# Altium footprint library Cty1.PcbLib: 869 footprints (part 53 of 55)
Each footprint in its own frame and in the unit in brackets; x right, y up, seen from the top. Pads: shape width x height; smd on the part's side, far side on the other; paste and mask are expansions set on the pad; w line width, h text height; cw(c..) or ccw(c..) is an arc to the next point about the centre after c.
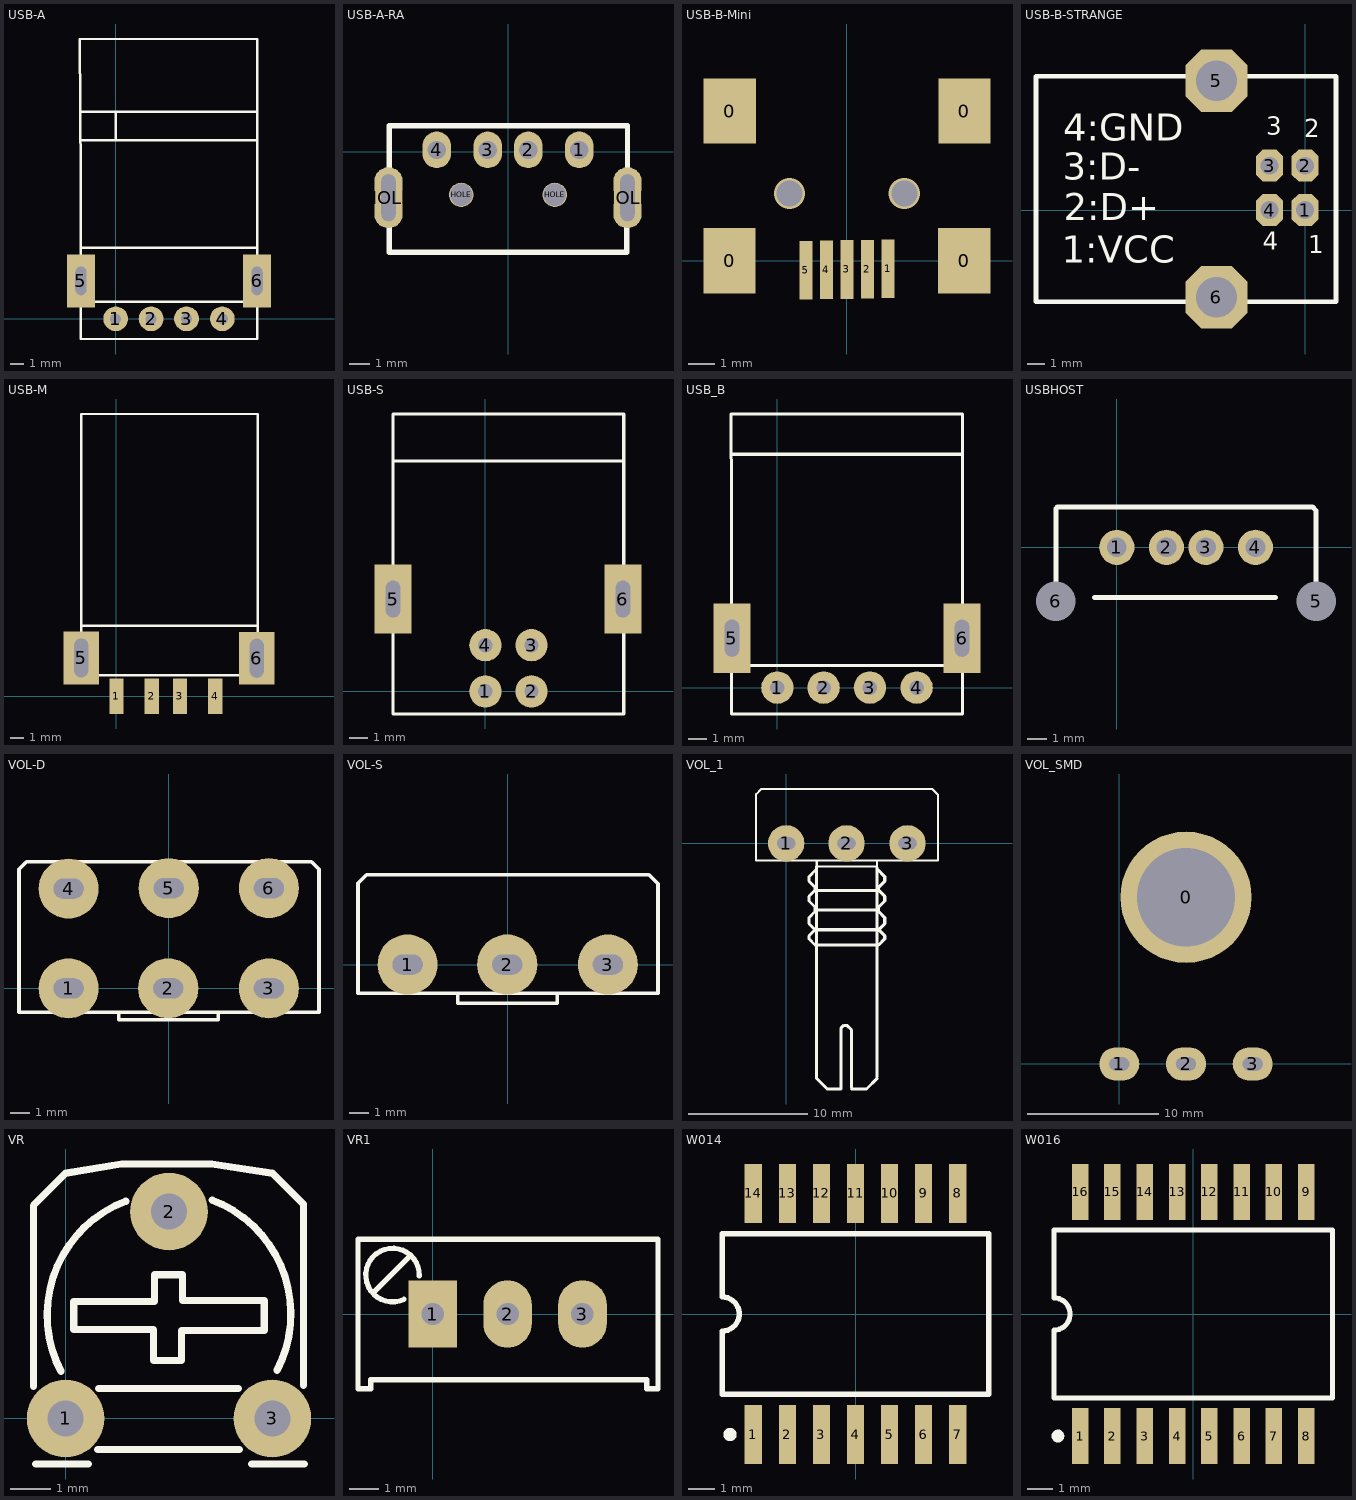
[diagram p52: the footprints below, top view; thin cyan lines are the x and y axes]

## USB-A [mil]
pads (6):
  round 70 hole 31: 1(0,0) 2(100,0) 3(200,0) 4(301,0)
  rect 80x150 hole 31 slot 80 at 90 deg: 5(-98,107) 6(399,107)
Top Overlay:
  lines w7: -99,200 400,200 ; -99,504 400,504 ; -99,584 400,584 ; -98,48 401,48 ; 0,504 0,584 ; -101.03,790 400,790 400,-57 -99,-57 -99,397 -101.03,790
3D body: height 177.17, standoff -51.16, extent -97.29,-0.22 399,784.22

## USB-A-RA [mm] "USB Type A"
pads (8):
  oval 1.4x1.8 hole 0.9: 1(3.5,0.08) 2(1,0.08) 3(-1,0.08) 4(-3.5,0.08)
  oval 1.4x3 hole 0.7 slot 2.3 at 90 deg: HOLE(-5.875,-2.27) HOLE(5.875,-2.27)
  round 1.2 hole 1.1: HOLE(-2.3,-2.13) HOLE(2.3,-2.13)
Top Overlay:
  lines w0.254: 5.842,-2.27 5.842,-4.953 -5.842,-4.953 -5.842,1.27 5.875,1.27 5.875,-2.27
Keep-Out Layer:
  lines w0.254: 5.842,-2.27 5.875,-2.27
3D body: height 2.18, standoff -3.52, extent -6.25,-19.8 6.25,0.23

## USB-B-Mini [mm]
pads (9):
  rect 2x2.5 smd: 0(-4.5,0) 0(-4.496,5.74) 0(4.5,0) 0(4.504,5.74)
  rect 0.5x2.25 smd: 1(1.575,-0.305) 2(0.787,-0.318) 3(0,-0.33) 4(-0.787,-0.343) 5(-1.575,-0.356)
via -2.2,2.58 diameter 1.2 hole 1
via 2.2,2.58 diameter 1.2 hole 1
3D body: height 3.95, standoff -1, extent -5.35,-0.673 5.35,8.527

## USB-B-STRANGE [mm] "USB Type B - STRANGE - Slave Device"
pads (6):
  oct 1.5x1.8 hole 1: 1(0,0) 2(0,2.5) 3(-2,2.5) 4(-2,0)
  oct 3.5x3.5 hole 2.3: 5(-4.988,7.283) 6(-4.988,-4.909)
Top Overlay:
  lines w0.254: -15.148,-5.163 1.743,-5.163 1.743,7.537 -15.148,7.537 -15.148,-5.163
  text "4" at -2.372,-2.242 h1
  text "2" at -0.035,4.108 h1
  text "3" at -2.194,4.235 h1
  text "1" at 0.193,-2.42 h1
  text "4:GND" at -13.624,3.905 h1.52
  text "3:D-" at -13.65,1.695 h1.52
  text "2:D+" at -13.574,-0.565 h1.52
  text "1:VCC" at -13.701,-2.978 h1.52
3D body: height 10.98, standoff -3.24, extent -15.45,-6.179 0.85,8.68

## USB-M [mil] "For USB SMD"
height 150
pads (6):
  rect 40x100 smd: 1(0,0) 2(100,0) 3(180,0) 4(280,0)
  rect 100x150 hole 40 slot 110 at 90 deg: 5(-100,109) 6(398,108)
Top Overlay:
  lines w7: -100,200 400,200 ; -100,60 -100,800 400,800 400,60 -100,60

## USB-S [mil] "USB B connector, 4pin, For Print"
height 100
pads (6):
  round 70 hole 31: 1(0,0) 2(100,0) 3(100,100) 4(0,100)
  rect 80x150 hole 31 slot 80 at 90 deg: 5(-200,200) 6(298,200)
Top Overlay:
  lines w7: -200,499 300,499 ; -200,-49 -200,601 300,601 300,-49 -200,-49
3D body: height 421.26, standoff -155.51, extent -243.31,-39.61 343.31,610

## USB_B [mil] "USB A connector, 4pin, For USB sing"
height 100
pads (6):
  round 70 hole 31: 1(0,0) 2(100,0) 3(200,0) 4(301,0)
  rect 80x150 hole 31 slot 80 at 90 deg: 5(-98,107) 6(399,107)
Top Overlay:
  lines w7: -99,504 400,504 ; -98,48 401,48 ; -100,591 -99,397 -99,-57 400,-57 400,591 -100,591
3D body: height 277.51, standoff -149.84, extent -162.02,-58 460.02,512.87

## USBHOST [mil]
pads (6):
  round 70 hole 39.37 unplated: 1(0,0) 2(98.6,0) 3(177.1,0) 4(275.6,0)
  round 70 hole 78.74 unplated: 5(396.6,-107) 6(-121.4,-107)
Top Overlay:
  lines w10: -121.4,-107 -121.4,77 -118.4,80 389.6,80 396.6,73 396.6,-107 ; -44.4,-100 315.6,-100

## VOL-D [mil] "Volume control Dual"
height 400
pads (6):
  round 120 hole 40 slot 60 at 0 deg: 1(-200,0) 2(-1,0) 3(200,0) 4(-200,199) 5(0,200) 6(200,200)
Top Overlay:
  lines w7: -100,-48 -100,-63 99,-63 99,-48 ; -299,-48 300,-48 300,238 285,253 -284,253 -299,238 -299,-48
3D body: height 834.65, standoff -129.92, extent -338.65,-1309.27 330.65,299

## VOL-S [mil] "Volume control single"
height 400
pads (3):
  round 120 hole 40 slot 60 at 0 deg: 1(-200,0) 2(-1,0) 3(200,0)
Top Overlay:
  lines w7: -100,-57 -100,-77 99,-77 99,-57 ; -299,-57 300,-57 300,161 282,179 -282,179 -299,162 -299,-57

## VOL_1 [mil]
pads (3):
  round 120 hole 40 slot 60 at 0 deg: 1(0,0) 2(199,0) 3(400,0)
Top Overlay:
  lines w7: 100,-57 100,-77 299,-77 299,-57 ; 101,-77 101,-57 ; -99,-57 500,-57 500,161 482,179 -82,179 -99,162 -99,-57
  lines w10: 95,-335 75,-315 75,-305 95,-285 75,-265 75,-245 95,-225 95,-210 75,-190 75,-175 95,-155 95,-145 75,-125 75,-110 100,-85 ; 95,-220 300,-220 ; 100,-770 100,-77 ; 100,-760 100,-775 135,-810 180,-810 180,-610 190,-600 200,-600 215,-615 215,-805 ; 100,-335 305,-335 325,-315 325,-305 305,-285 ; 100,-285 305,-285 ; 105,-155 300,-155 ; 215,-810 265,-810 300,-775 ; 300,-770 300,-80 ; 300,-85 325,-110 325,-125 305,-145 305,-155 325,-175 325,-190 305,-210 305,-225 325,-245 325,-265 305,-285
3D body: height 839.35, standoff -130, extent -110,-818.11 510,188.11

## VOL_SMD [mil]
pads (4):
  round 393.7 hole 295.28: 0(200,500)
  oval 120x100 hole 40 slot 60 at 0 deg: 1(0,0) 2(200,0) 3(400,0)
Bottom Overlay:
  circle w12: c400,150 r50
  circle w12: c200,150 r50
  circle w12: c0,150 r50
  circle w12: c200,500 r215.01
  lines w12: -57.25,301.71 cw(c200,500) 455.57,299.55 ; -55,299 127,299 ; -49,700 119,700 ; 281,298 455,298 ; 286,698 454,698 ; 455,295 500,250 500,-75 -100,-75 -100,255 ; -100,255 -55,300 -100,255
3D body: height 866.14, standoff -407.48, extent -203.15,-247.08 600,947.08

## VR [mil] "Resistor Variable"
height 200
pads (3):
  round 75 hole 35: 1(0,0) 2(100,200) 3(200,0)
Top Overlay:
  lines w7: -31,31 -31,206 0,237 54,246 141.5,246 200,237 230,207 230,32 ; -29,-44 22,-44 ; -4.35,45.34 cw(c100,100) 58.1,210.1 ; 8,113 8,86 85,86 85,56 112,56 112,85 192,85 192,114 113,114 113,139 86,139 86,113 9,113 ; 31,-30 168,-30 ; 32,29 167,29 ; 141.9,211.1 cw(c100,101) 204.35,46.34 ; 180,-44 231,-44
3D body: height 165.35, standoff -220.47, extent -86.85,-30 306.85,371.57

## VR1 [mil] "Variable Resistor"
height 400
pads (3):
  rect 65x90 hole 30: 1(0,0)
  oval 65x90 hole 30: 2(100,0) 3(200,0)
Top Overlay:
  lines w7: -80,28 -30,78 ; -38.6,19.63 cw(c-53.79,52.05) -18.01,50.77 ; -100,-100 -83,-100 -83,-88 286,-88 286,-100 301,-100 301,100 -100,100 -100,-100
3D body: height 455, standoff -45, extent -87.5,-130 287.5,110

## W014 [mm] "DFP; 14 Leads; Body 9.9 x 6.6 mm (LxW max); Pitch 1.27 mm"
height 2.03
pads (14):
  rect 0.65x2.2 smd: 1(-3.81,-4.5) 2(-2.54,-4.5) 3(-1.27,-4.5) 4(0,-4.5) 5(1.27,-4.5) 6(2.54,-4.5) 7(3.81,-4.5) 8(3.81,4.5) 9(2.54,4.5) 10(1.27,4.5) 11(0,4.5) 12(-1.27,4.5) 13(-2.54,4.5) 14(-3.81,4.5)
Top Overlay:
  circle w0.25: c-4.685,-4.5 r0.125
  lines w0.2: -4.975,-3 4.975,-3 4.975,3 -4.975,3 -4.975,0.635 cw(c-4.975,0) -4.975,-0.635 -4.975,-3

## W016 [mm] "DFP; 16 Leads; Body 10.9 x 7.2 mm (LxW max); Pitch 1.27 mm"
height 2.03
pads (16):
  rect 0.65x2.2 smd: 1(-4.445,-4.8) 2(-3.175,-4.8) 3(-1.905,-4.8) 4(-0.635,-4.8) 5(0.635,-4.8) 6(1.905,-4.8) 7(3.175,-4.8) 8(4.445,-4.8) 9(4.445,4.8) 10(3.175,4.8) 11(1.905,4.8) 12(0.635,4.8) 13(-0.635,4.8) 14(-1.905,4.8) 15(-3.175,4.8) 16(-4.445,4.8)
Top Overlay:
  circle w0.25: c-5.32,-4.8 r0.125
  lines w0.2: -5.475,-3.3 -5.475,-0.635 ccw(c-5.475,0) -5.475,0.635 -5.475,3.3 5.475,3.3 5.475,-3.3 -5.475,-3.3